# Altium schematic symbol library 13-Analog D 数模模数.SchLib: 573 symbols (part 5 of 6) (continued)
## NHI350AM2_Base (continued)
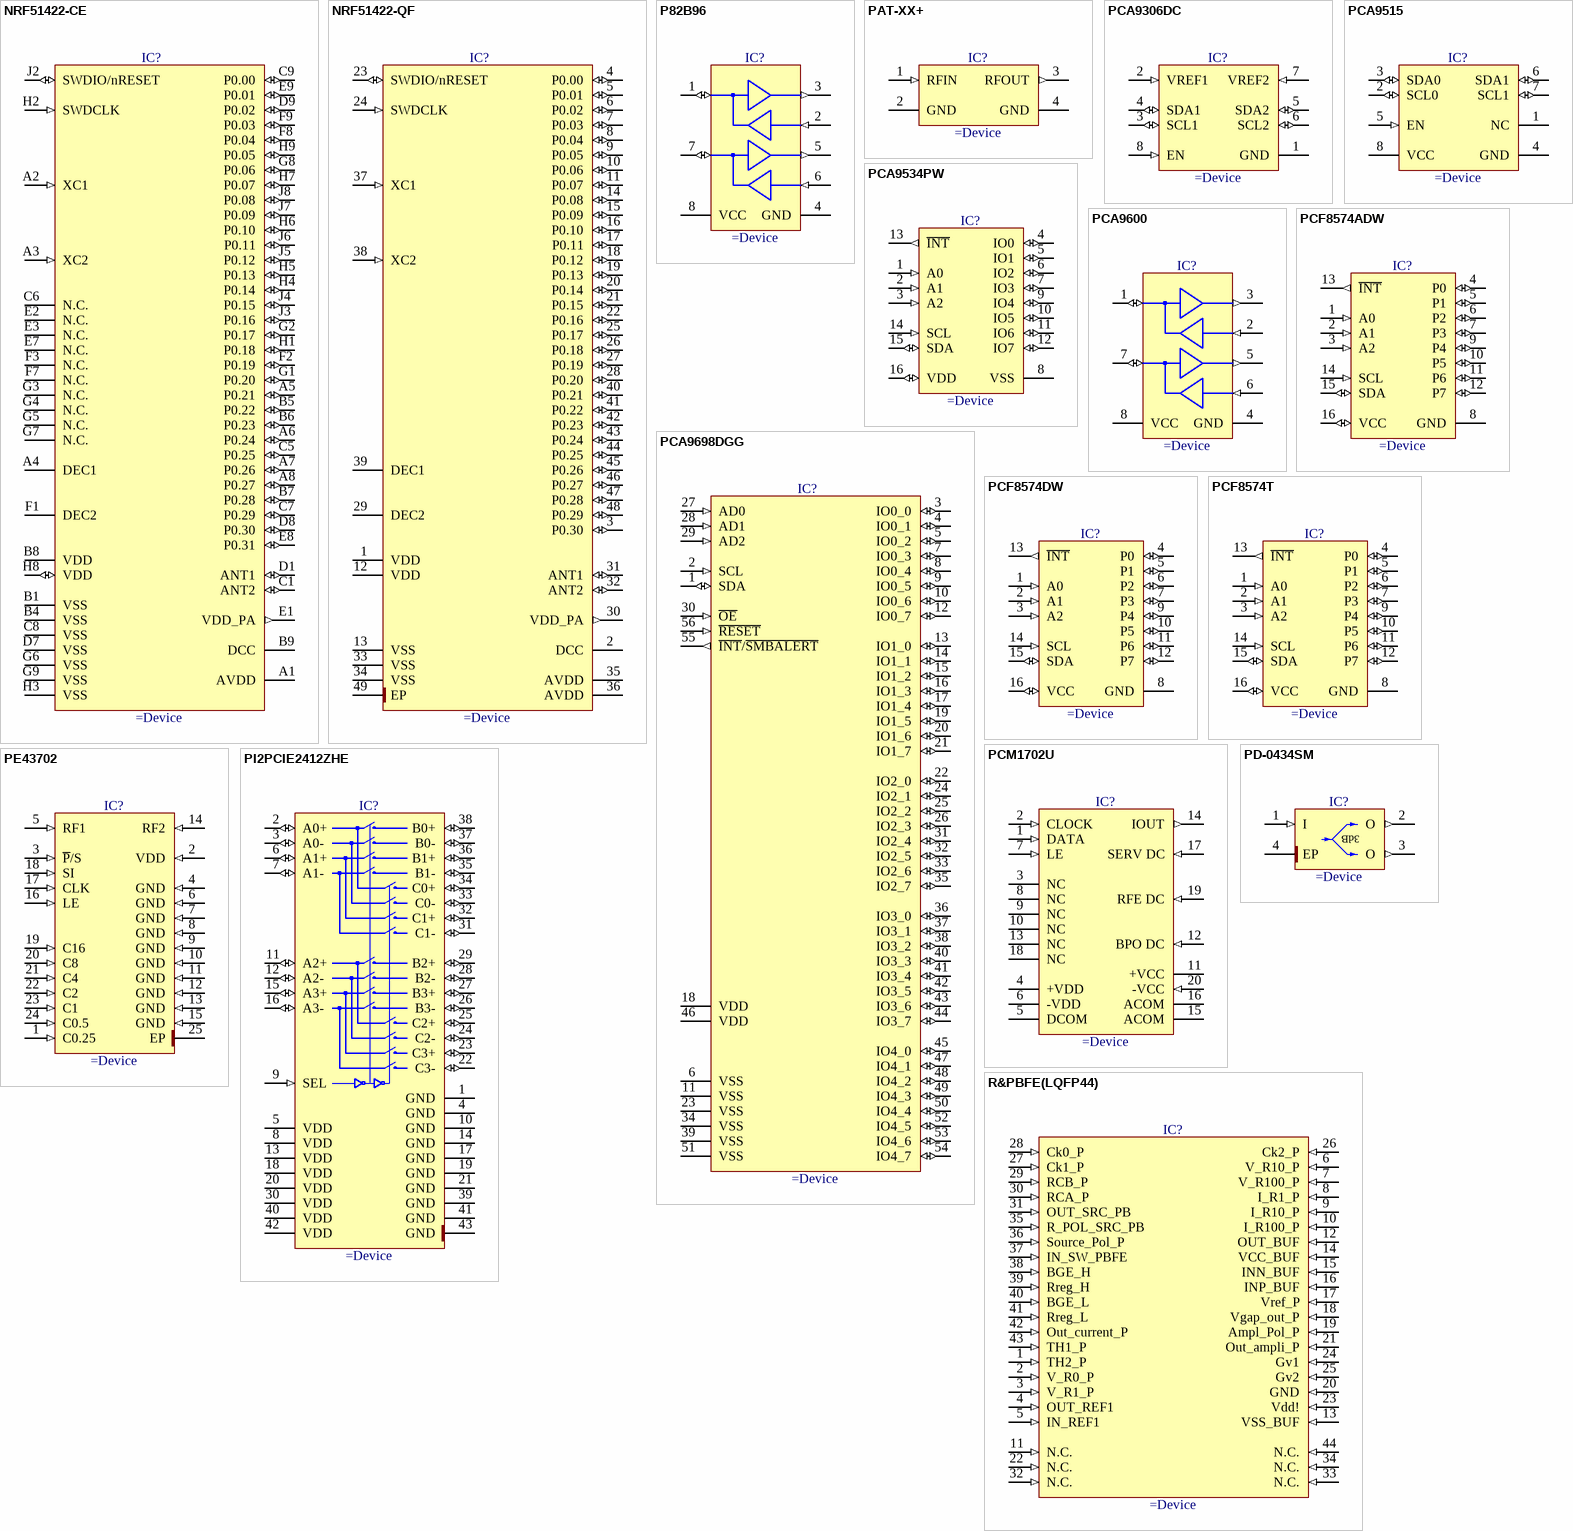
[diagram p32: symbols NRF51422-CE to R&PBFE(LQFP44)]

## NRF51422-CE
designator IC?
ANT and ANT/Bluetooth Low Energy Multiprotocol SoC
pins: A1 AVDD (power), A2 XC1 (in), A3 XC2 (in), A4 DEC1 (power), A5 P0.21 (io), A6 P0.24 (io), A7 P0.26 (io), A8 P0.27 (io), B1 VSS (power), B4 VSS (power), B5 P0.22 (io), B6 P0.23 (io), B7 P0.28 (io), B8 VDD (power), B9 DCC (power), C1 ANT2 (io), C5 P0.25 (io), C6 N.C., C7 P0.29 (io), C8 VSS (power), C9 P0.00 (io), D1 ANT1 (io), D7 VSS (power), D8 P0.30 (io), D9 P0.02 (io), E1 VDD_PA (out), E2 N.C., E3 N.C., E7 N.C., E8 P0.31 (io), E9 P0.01 (io), F1 DEC2 (power), F2 P0.19 (io), F3 N.C., F7 N.C., F8 P0.04 (io), F9 P0.03 (io), G1 P0.20 (io), G2 P0.17 (io), G3 N.C., G4 N.C., G5 N.C., G6 VSS (power), G7 N.C., G8 P0.06 (io), G9 VSS (power), H1 P0.18 (io), H2 SWDCLK (in), H3 VSS (power), H4 P0.14 (io), H5 P0.13 (io), H6 P0.10 (io), H7 P0.07 (io), H8 VDD (io), H9 P0.05 (io), J2 SWDIO/nRESET (io), J3 P0.16 (io), J4 P0.15 (io), J5 P0.12 (io), J6 P0.11 (io), J7 P0.09 (io), J8 P0.08 (io)

## NRF51422-QF
designator IC?
ANT and ANT/Bluetooth Low Energy Multiprotocol SoC
pins: 1 VDD (power), 2 DCC (power), 3 P0.30 (io), 4 P0.00 (io), 5 P0.01 (io), 6 P0.02 (io), 7 P0.03 (io), 8 P0.04 (io), 9 P0.05 (io), 10 P0.06 (io), 11 P0.07 (io), 12 VDD (power), 13 VSS (power), 14 P0.08 (io), 15 P0.09 (io), 16 P0.10 (io), 17 P0.11 (io), 18 P0.12 (io), 19 P0.13 (io), 20 P0.14 (io), 21 P0.15 (io), 22 P0.16 (io), 23 SWDIO/nRESET (io), 24 SWDCLK (in), 25 P0.17 (io), 26 P0.18 (io), 27 P0.19 (io), 28 P0.20 (io), 29 DEC2 (power), 30 VDD_PA (out), 31 ANT1 (io), 32 ANT2 (io), 33 VSS (power), 34 VSS (power), 35 AVDD (power), 36 AVDD (power), 37 XC1 (in), 38 XC2 (in), 39 DEC1 (power), 40 P0.21 (io), 41 P0.22 (io), 42 P0.23 (io), 43 P0.24 (io), 44 P0.25 (io), 45 P0.26 (io), 46 P0.27 (io), 47 P0.28 (io), 48 P0.29 (io), 49 EP (power)

## P82B96
designator IC?
Dual bidirectional bus buffer
pins: 1 Sx (io) "I2C-bus SDA", 2 Rx (in) "Receive Signal", 3 Tx (out) "Transmit Signal", 4 GND (power) "Negative Supply", 5 Ty (out) "Transmit Signal", 6 Ry (in) "Receive Signal", 7 Sy (io) "I2C-bus SCL", 8 VCC (power) "Positive Supply Voltage"

## PAT-XX+
designator IC?
DC to 7000MHz, 1W, 50 Ohm, Attenuator
pins: 1 RFIN (in), 2 GND (power), 3 RFOUT (out), 4 GND (power)

## PCA9306DC
designator IC?
Dual Bidirectional I2C Bus And SMBus Voltage-Level Translator
pins: 1 GND (power) "I2C-bus SDA", 2 VREF1 (in) "Receive Signal", 3 SCL1 (io) "Transmit Signal", 4 SDA1 (io) "Negative Supply", 5 SDA2 (io) "Transmit Signal", 6 SCL2 (io) "Receive Signal", 7 VREF2 (in) "I2C-bus SCL", 8 EN (in) "Positive Supply Voltage"

## PCA9515
designator IC?
I2C-Bus Repeater
pins: 1 NC "I2C-bus SCL", 2 SCL0 (io) "Transmit Signal", 3 SDA0 (io) "Negative Supply", 4 GND (power) "I2C-bus SDA", 5 EN (in) "Positive Supply Voltage", 6 SDA1 (io) "Transmit Signal", 7 SCL1 (io) "Receive Signal", 8 VCC (power) "Receive Signal"

## PCA9534PW
designator IC?
8-Bit I2C-Bus and SMBus Low Power I/O Port with Interrupt
pins: 1 A0 (in), 2 A1 (in), 3 A2 (in), 4 IO0 (io), 5 IO1 (io), 6 IO2 (io), 7 IO3 (io), 8 VSS (power), 9 IO4 (io), 10 IO5 (io), 11 IO6 (io), 12 IO7 (io), 13 ~{INT} (out), 14 SCL (in), 15 SDA (io), 16 VDD (io)

## PCA9600
designator IC?
Dual Bidirectional Bus Buffer
pins: 1 Sx (io) "I2C-bus SDA", 2 Rx (in) "Receive Signal", 3 Tx (out) "Transmit Signal", 4 GND (power) "Negative Supply", 5 Ty (out) "Transmit Signal", 6 Ry (in) "Receive Signal", 7 Sy (io) "I2C-bus SCL", 8 VCC (power) "Positive Supply Voltage"

## PCA9698DGG
designator IC?
40-bit Fm+ I2C-bus advanced I/O port with RESET/, OE/ and INT/
pins: 1 SDA (io), 2 SCL (in), 3 IO0_0 (io), 4 IO0_1 (io), 5 IO0_2 (io), 6 VSS (power), 7 IO0_3 (io), 8 IO0_4 (io), 9 IO0_5 (io), 10 IO0_6 (io), 11 VSS (power), 12 IO0_7 (io), 13 IO1_0 (io), 14 IO1_1 (io), 15 IO1_2 (io), 16 IO1_3 (io), 17 IO1_4 (io), 18 VDD (power), 19 IO1_5 (io), 20 IO1_6 (io), 21 IO1_7 (io), 22 IO2_0 (io), 23 VSS (power), 24 IO2_1 (io), 25 IO2_2 (io), 26 IO2_3 (io), 27 AD0 (in), 28 AD1 (in), 29 AD2 (in), 30 ~{OE} (in), 31 IO2_4 (io), 32 IO2_5 (io), 33 IO2_6 (io), 34 VSS (power), 35 IO2_7 (io), 36 IO3_0 (io), 37 IO3_1 (io), 38 IO3_2 (io), 39 VSS (power), 40 IO3_3 (io), 41 IO3_4 (io), 42 IO3_5 (io), 43 IO3_6 (io), 44 IO3_7 (io), 45 IO4_0 (io), 46 VDD (power), 47 IO4_1 (io), 48 IO4_2 (io), 49 IO4_3 (io), 50 IO4_4 (io), 51 VSS (power), 52 IO4_5 (io), 53 IO4_6 (io), 54 IO4_7 (io), 55 ~{INT}/~{SMBALERT} (out), 56 ~{RESET} (in)

## PCF8574ADW
designator IC?
Remote 8-bit I/O Expander For I2C Bus
pins: 1 A0 (in), 2 A1 (in), 3 A2 (in), 4 P0 (io), 5 P1 (io), 6 P2 (io), 7 P3 (io), 8 GND (power), 9 P4 (io), 10 P5 (io), 11 P6 (io), 12 P7 (io), 13 ~{INT} (out), 14 SCL (in), 15 SDA (io), 16 VCC (io)

## PCF8574DW
designator IC?
Remote 8-bit I/O Expander For I2C Bus
pins: 1 A0 (in), 2 A1 (in), 3 A2 (in), 4 P0 (io), 5 P1 (io), 6 P2 (io), 7 P3 (io), 8 GND (power), 9 P4 (io), 10 P5 (io), 11 P6 (io), 12 P7 (io), 13 ~{INT} (out), 14 SCL (in), 15 SDA (io), 16 VCC (io)

## PCF8574T
designator IC?
Remote 8-bit I/O Expander For I2C Bus
pins: 1 A0 (in), 2 A1 (in), 3 A2 (in), 4 P0 (io), 5 P1 (io), 6 P2 (io), 7 P3 (io), 8 GND (power), 9 P4 (io), 10 P5 (io), 11 P6 (io), 12 P7 (io), 13 ~{INT} (out), 14 SCL (in), 15 SDA (io), 16 VCC (io)

## PCM1702U
designator IC?
BiCMOS Advanced Sign Magnitude 20-Bit Digital-to-Analog Converter
pins: 1 DATA (in), 2 CLOCK (in), 3 NC, 4 +VDD (power), 5 DCOM (power), 6 -VDD (power), 7 LE (in), 8 NC, 9 NC, 10 NC, 11 +VCC (power), 12 BPO DC (in), 13 NC, 14 IOUT (out), 15 ACOM (power), 16 ACOM (power), 17 SERV DC (in), 18 NC, 19 RFE DC (in), 20 -VCC (in)

## PD-0434SM
designator IC?
4 to 34 GHz Wilkinson Power Divider
pins: 1 I (in), 2 O (out), 3 O (out), 4 EP (power)
text: 3dB

## PE43702
designator IC?
50 Ohm 7-Bit RF Digital Step Attenuator (DSA)
pins: 1 C0.25 (in), 2 VDD (in), 3 ~{P}/S (in), 4 GND (in), 5 RF1 (in), 6 GND (in), 7 GND (in), 8 GND (in), 9 GND (in), 10 GND (in), 11 GND (in), 12 GND (in), 13 GND (in), 14 RF2 (in), 15 GND (in), 16 LE (in), 17 CLK (in), 18 SI (in), 19 C16 (in), 20 C8 (in), 21 C4 (in), 22 C2 (in), 23 C1 (in), 24 C0.5 (in), 25 EP (power)

## PI2PCIE2412ZHE
designator IC?
1.8V, PCI Express Gen2 Compliant, 4-Differential Channel, 2:1 Mux/DeMux Switch
pins: 1 GND (power), 2 A0+ (io), 3 A0- (io), 4 GND (power), 5 VDD (power), 6 A1+ (io), 7 A1- (io), 8 VDD (power), 9 SEL (in), 10 GND (power), 11 A2+ (io), 12 A2- (io), 13 VDD (power), 14 GND (power), 15 A3+ (io), 16 A3- (io), 17 GND (power), 18 VDD (power), 19 GND (power), 20 VDD (power), 21 GND (power), 22 C3- (io), 23 C3+ (io), 24 C2- (io), 25 C2+ (io), 26 B3- (io), 27 B3+ (io), 28 B2- (io), 29 B2+ (io), 30 VDD (power), 31 C1- (io), 32 C1+ (io), 33 C0- (io), 34 C0+ (io), 35 B1- (io), 36 B1+ (io), 37 B0- (io), 38 B0+ (io), 39 GND (power), 40 VDD (power), 41 GND (power), 42 VDD (power), 43 GND (power)

## R&PBFE(LQFP44)
designator IC?
Resistance & Pressure Bridge Front End (LQFP44 CERN ASIC)
pins: 1 TH2_P (in), 2 V_R0_P (in), 3 V_R1_P (in), 4 OUT_REF1 (in), 5 IN_REF1 (in), 6 V_R10_P (in), 7 V_R100_P (in), 8 I_R1_P (in), 9 I_R10_P (in), 10 I_R100_P (in), 11 N.C. (in), 12 OUT_BUF (in), 13 VSS_BUF (in), 14 VCC_BUF (in), 15 INN_BUF (in), 16 INP_BUF (in), 17 Vref_P (in), 18 Vgap_out_P (in), 19 Ampl_Pol_P (in), 20 GND (in), 21 Out_ampli_P (in), 22 N.C. (in), 23 Vdd! (in), 24 Gv1 (in), 25 Gv2 (in), 26 Ck2_P (in), 27 Ck1_P (in), 28 Ck0_P (in), 29 RCB_P (in), 30 RCA_P (in), 31 OUT_SRC_PB (in), 32 N.C. (in), 33 N.C. (in), 34 N.C. (in), 35 R_POL_SRC_PB (in), 36 Source_Pol_P (in), 37 IN_SW_PBFE (in), 38 BGE_H (in), 39 Rreg_H (in), 40 BGE_L (in), 41 Rreg_L (in), 42 Out_current_P (in), 43 TH1_P (in), 44 N.C. (in)

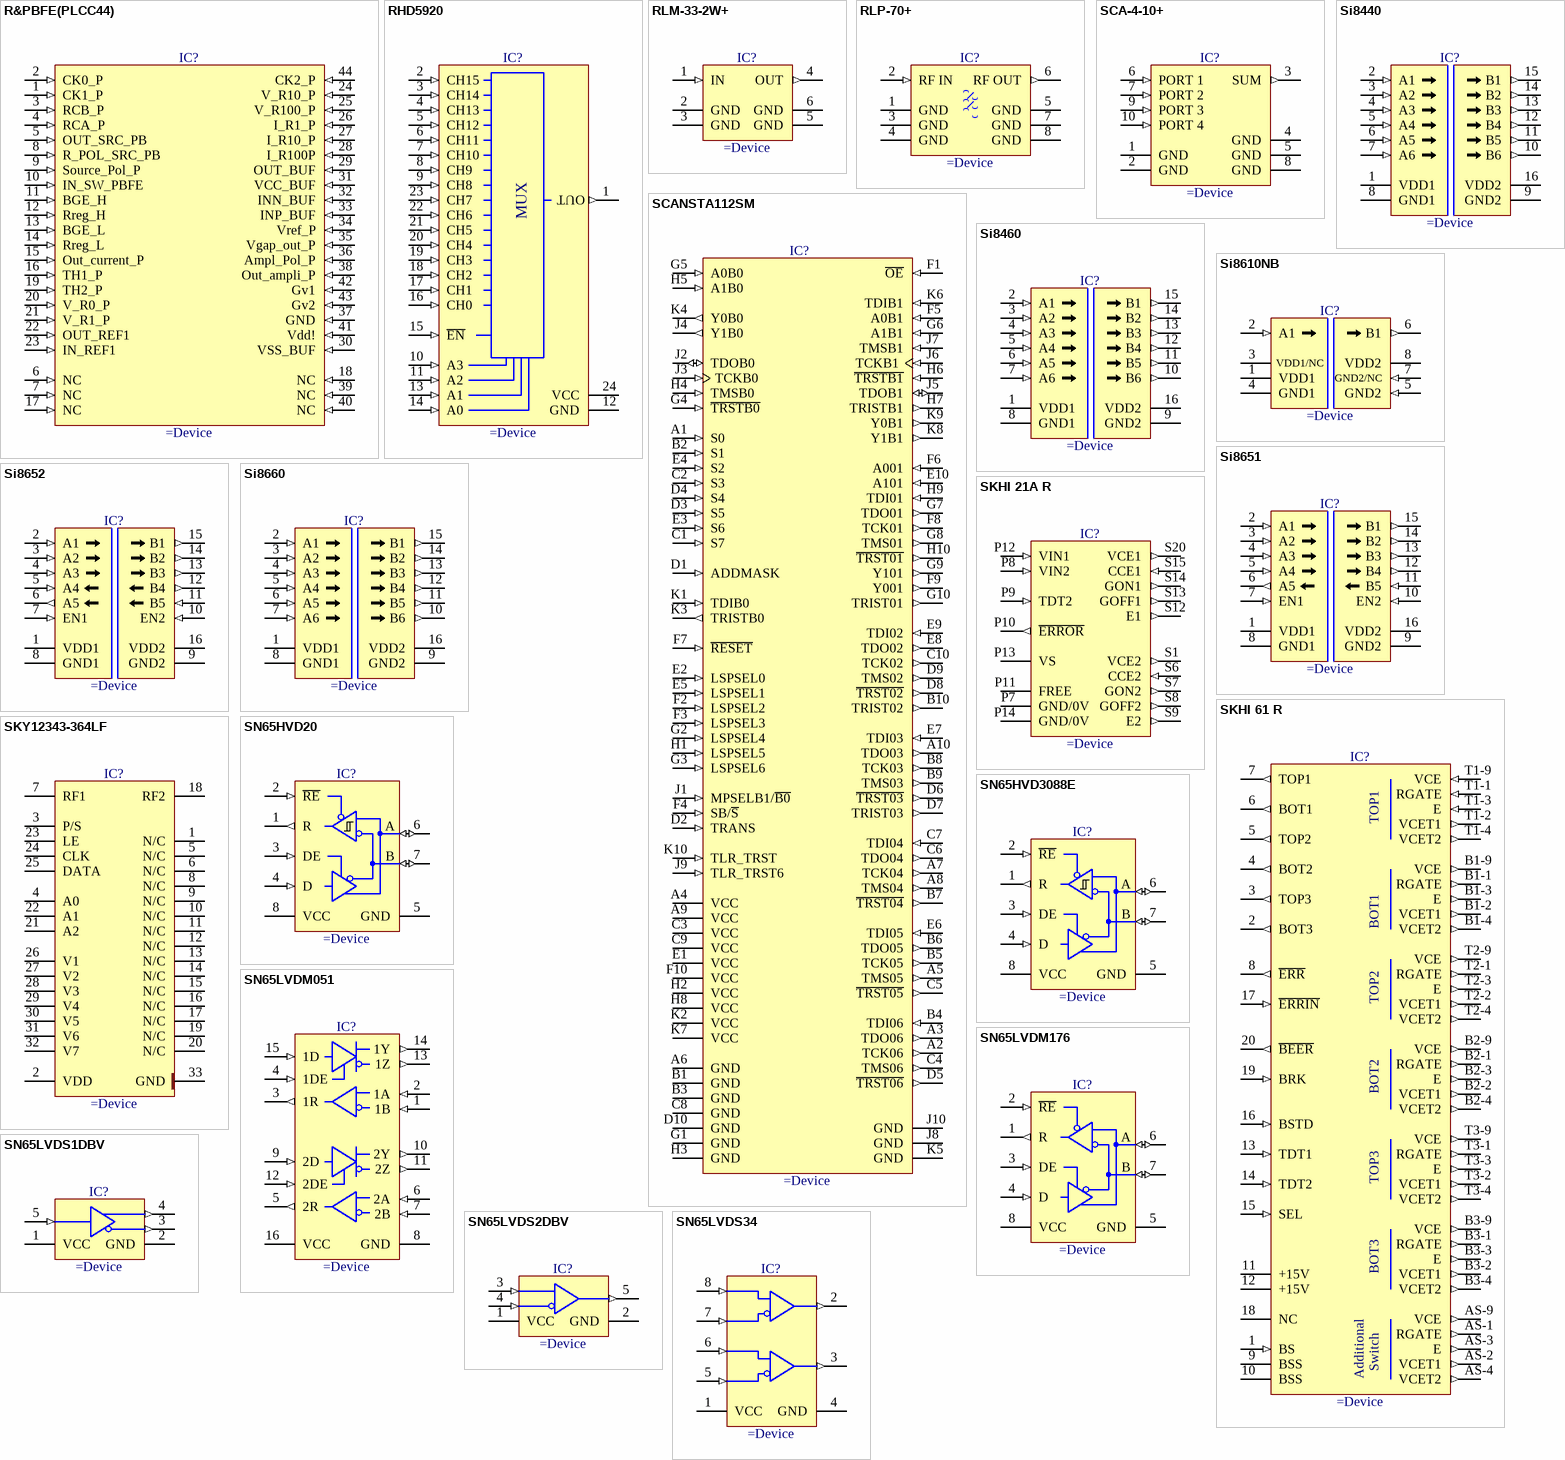
[diagram p33: symbols R&PBFE(PLCC44) to SN65LVDS34]

## R&PBFE(PLCC44)
designator IC?
Resistance & Pressure Bridge Front End (PLCC44 CERN ASIC)
pins: 1 CK1_P (in), 2 CK0_P (in), 3 RCB_P (in), 4 RCA_P (in), 5 OUT_SRC_PB (in), 6 NC (in), 7 NC (in), 8 R_POL_SRC_PB (in), 9 Source_Pol_P (in), 10 IN_SW_PBFE (in), 11 BGE_H (in), 12 Rreg_H (in), 13 BGE_L (in), 14 Rreg_L (in), 15 Out_current_P (in), 16 TH1_P (in), 17 NC (in), 18 NC (in), 19 TH2_P (in), 20 V_R0_P (in), 21 V_R1_P (in), 22 OUT_REF1 (in), 23 IN_REF1 (in), 24 V_R10_P (in), 25 V_R100_P (in), 26 I_R1_P (in), 27 I_R10_P (in), 28 I_R100P (in), 29 OUT_BUF (in), 30 VSS_BUF (in), 31 VCC_BUF (in), 32 INN_BUF (in), 33 INP_BUF (in), 34 Vref_P (in), 35 Vgap_out_P (in), 36 Ampl_Pol_P (in), 37 GND (in), 38 Out_ampli_P (in), 39 NC (in), 40 NC (in), 41 Vdd! (in), 42 Gv1 (in), 43 Gv2 (in), 44 CK2_P (in)

## RHD5920
designator IC?
RadHard-by-Design, 16-Channel Analog Multiplexer
pins: 1 VOUT (out), 2 CH15 (in), 3 CH14 (in), 4 CH13 (in), 5 CH12 (in), 6 CH11 (in), 7 CH10 (in), 8 CH9 (in), 9 CH8 (in), 10 A3 (in), 11 A2 (in), 12 GND (power), 13 A1 (in), 14 A0 (in), 15 ~{EN} (in), 16 CH0 (in), 17 CH1 (in), 18 CH2 (in), 19 CH3 (in), 20 CH4 (in), 21 CH5 (in), 22 CH6 (in), 23 CH7 (in), 24 VCC (power)
text: MUX; OUT

## RLM-33-2W+
designator IC?
50 Ohm, 0.2 to 3000MHz, +12 to +33dBm Limiter
pins: 1 IN (in), 2 GND (power), 3 GND (power), 4 OUT (out), 5 GND (power), 6 GND (power)

## RLP-70+
designator IC?
DC to 70MHz 50 OHM Low Pass Filter
pins: 1 GND (power), 2 RF IN (in), 3 GND (power), 4 GND (power), 5 GND (power), 6 RF OUT (out), 7 GND (power), 8 GND (power)

## SCA-4-10+
designator IC?
4 Way-0° 50 OHM 5 to 1000 MHz Power Splitter/Combiner
pins: 1 GND (power), 2 GND (power), 3 SUM (out), 4 GND (power), 5 GND (power), 6 PORT 1 (in), 7 PORT 2 (in), 8 GND (power), 9 PORT 3 (in), 10 PORT 4 (in)

## SCANSTA112SM
designator IC?
7-Port Multidrop IEEE 1149.1 (JTAG) Multiplexer
pins: A1 S0 (in), A2 TCK06 (out), A3 TDO06 (out), A4 VCC (power), A5 TMS05 (out), A6 GND (power), A7 TCK04 (out), A8 TMS04 (out), A9 VCC (power), A10 TDO03 (out), B1 GND (power), B2 S1 (in), B3 GND (power), B4 TDI06 (in), B5 TCK05 (out), B6 TDO05 (out), B7 ~{TRST04} (out), B8 TCK03 (out), B9 TMS03 (out), B10 TRIST02 (out), C1 S7 (in), C2 S3 (in), C3 VCC (power), C4 TMS06 (out), C5 ~{TRST05} (out), C6 TDO04 (out), C7 TDI04 (in), C8 GND (power), C9 VCC (power), C10 TCK02 (out), D1 ADDMASK (in), D2 TRANS (in), D3 S5 (in), D4 S4 (in), D5 ~{TRST06} (out), D6 ~{TRST03} (out), D7 TRIST03 (out), D8 ~{TRST02} (out), D9 TMS02 (out), D10 GND (power), E1 VCC (power), E2 LSPSEL0 (in), E3 S6 (in), E4 S2 (in), E5 LSPSEL1 (in), E6 TDI05 (in), E7 TDI03 (in), E8 TDO02 (out), E9 TDI02 (in), E10 A101 (in), F1 ~{OE} (in), F2 LSPSEL2 (in), F3 LSPSEL3 (in), F4 SB/~{S} (in), F5 A0B1 (in), F6 A001 (in), F7 ~{RESET} (in), F8 TCK01 (out), F9 Y001 (out), F10 VCC (power), G1 GND (power), G2 LSPSEL4 (in), G3 LSPSEL6 (in), G4 ~{TRSTB0} (in), G5 A0B0 (in), G6 A1B1 (in), G7 TDO01 (out), G8 TMS01 (out), G9 Y101 (out), G10 TRIST01 (out), H1 LSPSEL5 (in), H2 VCC (power), H3 GND (power), H4 TMSB0 (in), H5 A1B0 (in), H6 ~{TRSTB1} (in), H7 TRISTB1 (out), H8 VCC (power), H9 TDI01 (in), H10 ~{TRST01} (out), J1 MPSELB1/~{B0} (in), J2 TDOB0 (io), J3 TCKB0 (in), J4 Y1B0 (out), J5 TDOB1 (io), J6 TCKB1 (in), J7 TMSB1 (in), J8 GND (power), J9 TLR_TRST6 (in), J10 GND (power), K1 TDIB0 (in), K2 VCC (power), K3 TRISTB0 (out), K4 Y0B0 (out), K5 GND (power), K6 TDIB1 (in), K7 VCC (power), K8 Y1B1 (out), K9 Y0B1 (out), K10 TLR_TRST (in)

## Si8440
designator IC?
Low Power Quad-Channel Digital Isolator
pins: 1 VDD1 (power), 2 A1 (in), 3 A2 (in), 4 A3 (in), 5 A4 (in), 6 A5 (in), 7 A6 (in), 8 GND1 (power), 9 GND2 (power), 10 B6 (out), 11 B5 (out), 12 B4 (out), 13 B3 (out), 14 B2 (out), 15 B1 (out), 16 VDD2 (power)

## Si8460
designator IC?
ISOpro Low Power Six-Channel Digital Isolator
pins: 1 VDD1 (power), 2 A1 (in), 3 A2 (in), 4 A3 (in), 5 A4 (in), 6 A5 (in), 7 A6 (in), 8 GND1 (power), 9 GND2 (power), 10 B6 (out), 11 B5 (out), 12 B4 (out), 13 B3 (out), 14 B2 (out), 15 B1 (out), 16 VDD2 (power)

## Si8610NB
designator IC?
Low Power Single-Channel Digital Isolator
pins: 1 VDD1 (power), 2 A1 (in), 3 VDD1/NC, 4 GND1 (power), 5 GND2 (in), 6 B1 (out), 7 GND2/NC (in), 8 VDD2 (power)

## Si8651
designator IC?
Low Power Five-Channel Digital Isolator
pins: 1 VDD1 (power), 2 A1 (in), 3 A2 (in), 4 A3 (in), 5 A4 (in), 6 A5 (out), 7 EN1 (in), 8 GND1 (power), 9 GND2 (power), 10 EN2 (in), 11 B5 (in), 12 B4 (out), 13 B3 (out), 14 B2 (out), 15 B1 (out), 16 VDD2 (power)

## Si8652
designator IC?
Low Power Five-Channel Digital Isolator
pins: 1 VDD1 (power), 2 A1 (in), 3 A2 (in), 4 A3 (in), 5 A4 (in), 6 A5 (out), 7 EN1 (in), 8 GND1 (power), 9 GND2 (power), 10 EN2 (in), 11 B5 (in), 12 B4 (out), 13 B3 (out), 14 B2 (out), 15 B1 (out), 16 VDD2 (power)

## Si8660
designator IC?
Low Power Six-Channel Digital Isolator
pins: 1 VDD1 (power), 2 A1 (in), 3 A2 (in), 4 A3 (in), 5 A4 (in), 6 A5 (in), 7 A6 (in), 8 GND1 (power), 9 GND2 (power), 10 B6 (out), 11 B5 (out), 12 B4 (out), 13 B3 (out), 14 B2 (out), 15 B1 (out), 16 VDD2 (power)

## SKHI 21A R
designator IC?
1200V/8A Hybrid Dual MOSFET Driver
pins: P7 GND/0V (power), P8 VIN2 (in), P9 TDT2 (in), P10 ~{ERROR} (out), P11 FREE, P12 VIN1 (in), P13 VS (power), P14 GND/0V (power), S1 VCE2 (out), S6 CCE2 (in), S7 GON2 (out), S8 GOFF2 (out), S9 E2 (out), S12 E1 (out), S13 GOFF1 (out), S14 GON1 (out), S15 CCE1 (in), S20 VCE1 (out)